# Altium footprint library connectors_socets.pcblib: 601 footprints (part 9 of 38)
Each footprint in its own frame and in the unit in brackets; x right, y up, seen from the top. Pads: shape width x height; smd on the part's side, far side on the other; paste and mask are expansions set on the pad; w line width, h text height; cw(c..) or ccw(c..) is an arc to the next point about the centre after c.
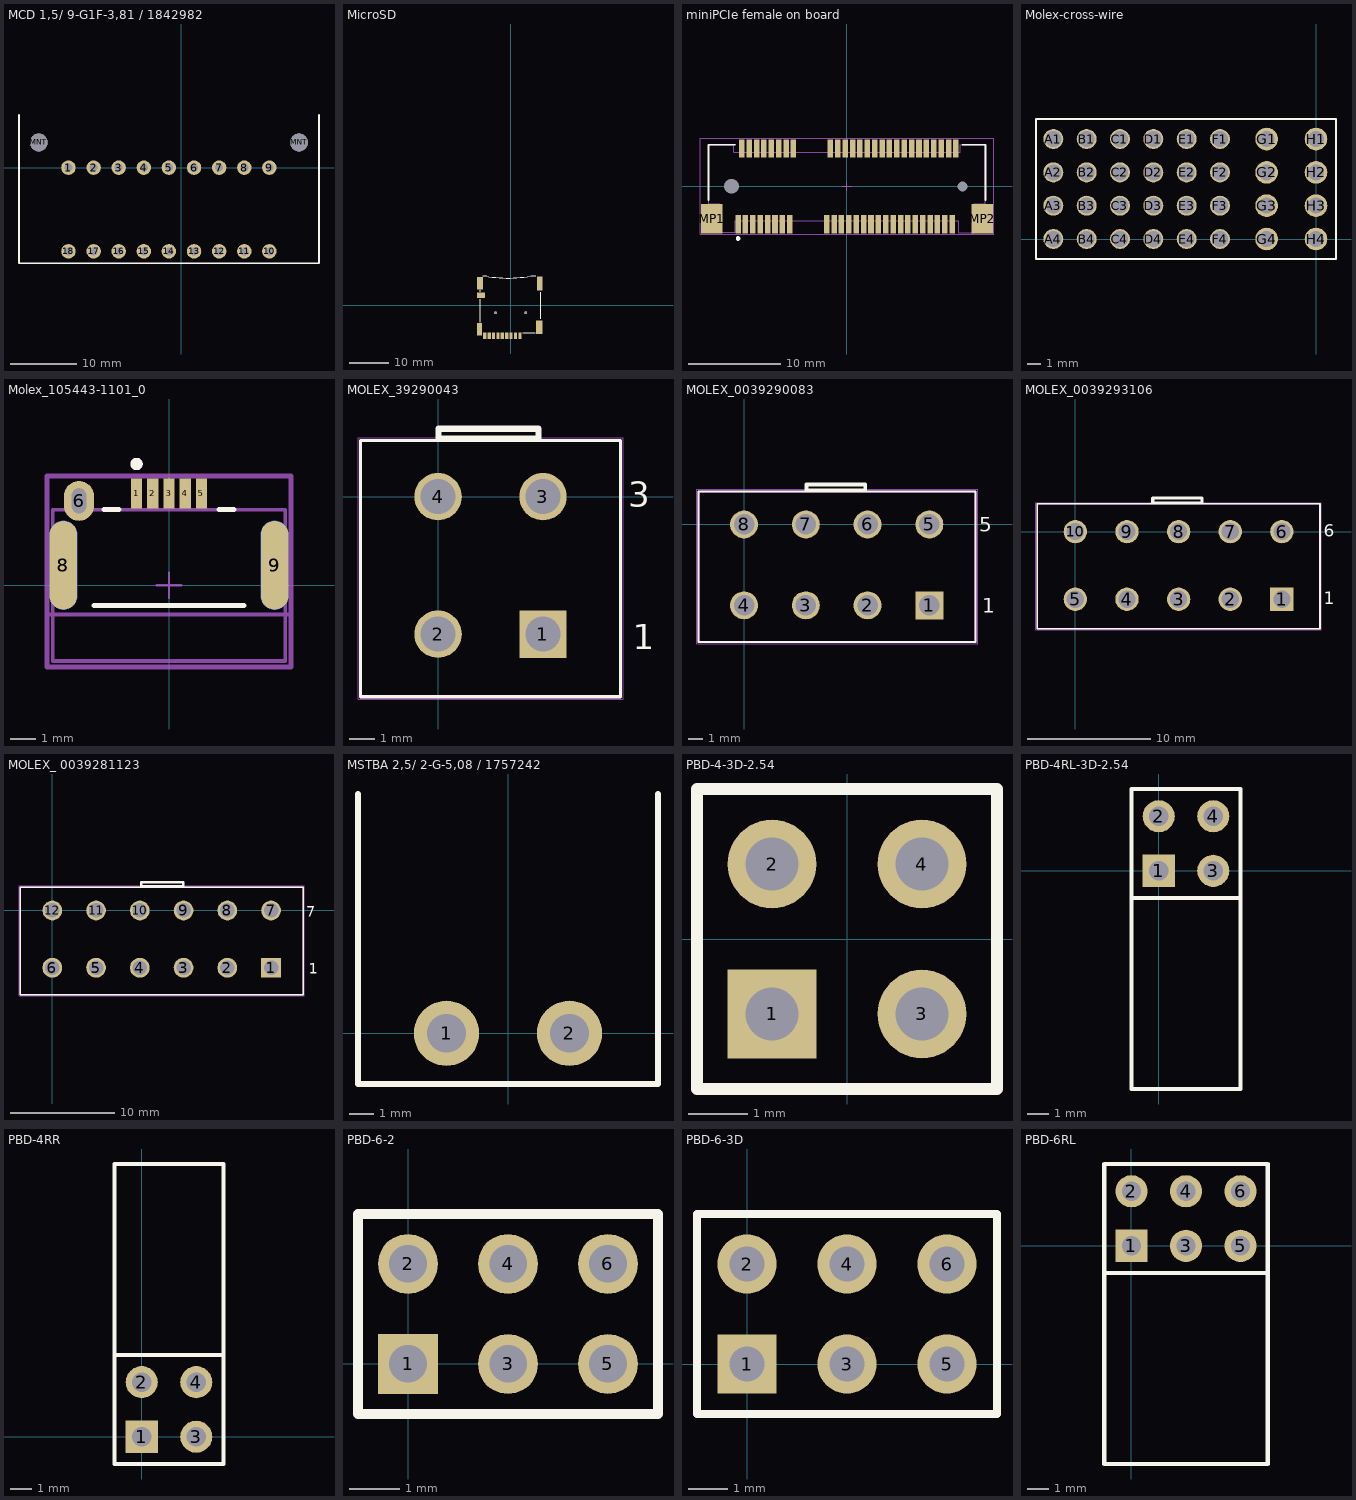
[diagram p8: the footprints below, top view; thin cyan lines are the x and y axes]

## MCD 1,5/ 9-G1F-3,81 / 1842982 [mm]
pads (20):
  round 2.2 hole 1.2: 1(-17.145,0) 2(-13.335,0) 3(-9.525,0) 4(-5.715,0) 5(-1.905,0) 6(1.905,0) 7(5.715,0) 8(9.525,0) 9(13.335,0) 10(13.335,-12.7) 11(9.525,-12.7) 12(5.715,-12.7) 13(1.905,-12.7) 14(-1.905,-12.7) 15(-5.715,-12.7) 16(-9.525,-12.7) 17(-13.335,-12.7) 18(-17.145,-12.7)
  round 2.7 hole 2.7 unplated: MNT(-21.645,3.81) MNT(17.835,3.81)
Top Overlay:
  lines w0.254: -24.645,8 -24.645,-14.5 20.855,-14.5 20.855,8
3D body "pxc_1842982_03_MCD-1-5-9-G1F-3-81_3D.stp": height 22.75, standoff -3.45, extent -24.25,-13.9 20.43,8

## MicroSD [mm]
pads (16):
  rect 1.2x3.1 smd: 0(-7.79,-6.044)
  rect 1.5x3.1 smd: 0(-7.64,5.456)
  round 0.7 hole 0.7 unplated: 0(-3.74,-1.894) 0(3.81,-1.894)
  rect 1.6x3.5 smd: 0(7.21,-5.544)
  rect 1.4x3.5 smd: 0(7.313,5.463)
  rect 0.8x1.6 smd: 1(2.335,-7.694) 2(1.235,-7.694) 3(0.135,-7.694) 4(-0.965,-7.694) 5(-2.065,-7.694) 6(-3.165,-7.694) 7(-4.265,-7.694) 8(-5.365,-7.694)
  rect 0.85x1.6 smd: 9(-6.515,-7.694)
  rect 1.95x1.4 smd: 10(-7.415,2.506)
Top Overlay:
  lines w0.127: -7.62,-4.307 -7.62,1.535 ; -7.62,3.313 -7.62,3.821 ; -6.985,7.377 -5.928,7.377 ; -6.362,7.345 ccw(c-0.637,36.794) 5.087,7.345 ; 3.01,-6.969 5.735,-6.969 6.16,-6.969 ; 5.08,7.377 6.35,7.377 6.345,7.382 ; 7.62,-3.418 7.62,3.186
3D body "User Library-Socket-MicroSD-Type1-with-SDCard.step": height 1.91, standoff -0.43, extent -7.75,-7.3 6.35,12.8

## miniPCIe female on board [mm]
pads (56):
  rect 0.6x2 smd: 1(-11.8,-4.1) 2(-11.4,4.1) 3(-11,-4.1) 4(-10.6,4.1) 5(-10.2,-4.1) 6(-9.8,4.1) 7(-9.4,-4.1) 8(-9,4.1) 9(-8.6,-4.1) 10(-8.2,4.1) 11(-7.8,-4.1) 12(-7.4,4.1) 13(-7,-4.1) 14(-6.6,4.1) 15(-6.2,-4.1) 16(-5.8,4.1) 17(-2.2,-4.1) 18(-1.8,4.1) 19(-1.4,-4.1) 20(-1,4.1) 21(-0.6,-4.1) 22(-0.2,4.1) 23(0.2,-4.1) 24(0.6,4.1) 25(1,-4.1) 26(1.4,4.1) 27(1.8,-4.1) 28(2.2,4.1) 29(2.6,-4.1) 30(3,4.1) 31(3.4,-4.1) 32(3.8,4.1) 33(4.2,-4.1) 34(4.6,4.1) 35(5,-4.1) 36(5.4,4.1) 37(5.8,-4.1) 38(6.2,4.1) 39(6.6,-4.1) 40(7,4.1) 41(7.4,-4.1) 42(7.8,4.1) 43(8.2,-4.1) 44(8.6,4.1) 45(9,-4.1) 46(9.4,4.1) 47(9.8,-4.1) 48(10.2,4.1) 49(10.6,-4.1) 50(11,4.1) 51(11.4,-4.1) 52(11.8,4.1)
  round 1.3 hole 1.6 unplated: MH1(-12.5,0)
  round 0.8 hole 1.1 unplated: MH2(12.5,0)
  rect 2.3x3.2 smd: MP1(-14.65,-3.5) MP2(14.65,-3.5)
Top Overlay:
  circle w0.25: c-11.8,-5.65 r0.125
  lines w0.2: -15,-1.5 -15,4.5 -12.1,4.5 ; 12.5,4.5 15,4.5 15,-1.5
Plata3D:
  lines w0.1: -15,-1.9 -15,4.5 -12.25,4.5 -12.25,3.7 12.25,3.7 12.25,4.5 15,4.5 15,-1.9 13.79,-1.9 13.79,-5 12.1,-5 12.1,-3.7 -12.1,-3.7 -12.1,-5 -13.79,-5 -13.79,-1.9 -15,-1.9
Board3D:
  lines w0.05: -15.9,-5.2 15.9,-5.2 15.9,5.2 -15.9,5.2 -15.9,-5.2
  lines w0.1: -0.5,0 0.5,0 ; 0,-0.5 0,0.5
3D body: height 0.82, standoff 0.2, extent 15,4.5 15,4.5
3D body "292443-1.STEP": height 5.61, standoff -0.59, extent -15,-5 15,4.5

## Molex-cross-wire [mm]
height 8
pads (32):
  round 1.5 hole 1.2: A1(-19.7,7.499) A2(-19.7,4.999) A3(-19.7,2.5) A4(-19.7,0) B1(-17.2,7.499) B2(-17.2,4.999) B3(-17.2,2.5) B4(-17.2,0) C1(-14.7,7.499) C2(-14.7,4.999) C3(-14.7,2.5) C4(-14.7,0) D1(-12.2,7.499) D2(-12.2,4.999) D3(-12.2,2.5) D4(-12.2,0) E1(-9.7,7.499) E2(-9.7,4.999) E3(-9.7,2.5) E4(-9.7,0) F1(-7.2,7.499) F2(-7.2,4.999) F3(-7.2,2.5) F4(-7.2,0)
  round 1.7 hole 1.2: G1(-3.7,7.499) G2(-3.7,4.999) G3(-3.7,2.5) G4(-3.7,0) H1(0,7.499) H2(0,4.999) H3(0,2.5) H4(0,0)
Top Overlay:
  lines w0.18: -21,-1.5 -21,9 1.5,9 1.5,-1.5 -21,-1.5

## Molex_105443-1101_0 [mm]
pads (10):
  rect 0.45x1.2 smd paste+0 mask+0: 1(-1.3,3.675) 2(-0.65,3.675) 3(0,3.675) 4(0.65,3.675) 5(1.3,3.675)
  oval 1.2x1.6 hole 1 slot 0.6 at 0 deg paste-2539.97 mask+0: 6(-3.6,3.375)
  oval 1.1x3.55 smd paste-1000 mask+0: 8(-4.225,0.8) 9(4.225,0.8)
  oval 1.1x3.55 smd far side paste-1000 mask+0: 8(-4.225,0.8) 9(4.225,0.8)
Top Overlay:
  circle w0.25: c-1.3,4.85 r0.125
  lines w0.2: -3,-0.8 3,-0.8 ; -2.6,3.025 -2,3.025 ; 2,3.025 2.6,3.025
Mechanical 10:
  lines w0.2: -4.875,-3.275 -4.875,4.375 4.875,4.375 4.875,-3.275 -4.875,-3.275
  text ".Designator" at 0,0.55 h1
Mechanical 12:
  lines w0.15: -4.875,-1.175 4.875,-1.175 ; -4.65,-3.025 -4.65,3.025 4.65,3.025 4.65,-3.025 -4.65,-3.025
Board3D:
  lines w0.1: -0.5,0 0.5,0 ; 0,-0.5 0,0.5
  lines w0.2: -4.875,-3.275 -4.875,4.375 4.875,4.375 4.875,-3.275 -4.875,-3.275
3D body "3dmodel.step": height 0.25, standoff 0, extent -4.875,-3.275 4.875,4.375

## MOLEX_39290043 [mm]
height 12.8
pads (4):
  rect 1.9x1.9 / inner round 1.9 / far side rect 1.9x1.9 hole 1.4 mask+0.076: 1(4.2,-5.5)
  round 1.9 hole 1.4 mask+0.076: 2(0,-5.5) 3(4.2,0) 4(0,0)
Top Overlay:
  lines w0.127: -3.1,-8 -3.1,2.25 7.3,2.25 7.3,-8 -3.1,-8
  lines w0.254: 0.017,2.314 4.017,2.314 4.017,2.714 0.017,2.714 0.017,2.314
  text "1" at 7.8,-6.1 h1
  text "3" at 7.6,-0.4 h1
Plata3D:
  lines w0.127: -3.1,-8 -3.1,2.25 7.3,2.25 7.3,-8 -3.1,-8
Board3D:
  lines w0.05: -3.2,-8.1 -3.2,2.356 7.4,2.356 7.4,-8.1 -3.2,-8.1
3D body "39-29-0043--3DModel-STEP-361473.STEP": height 12.8, standoff -3.5, extent -3.1,-7.725 7.297,3.275

## MOLEX_0039290083 [mm]
height 12.8
pads (8):
  rect 1.9x1.9 / inner round 1.9 / far side rect 1.9x1.9 hole 1.4 mask+0.076: 1(12.6,-5.5)
  round 1.9 hole 1.4 mask+0.076: 2(8.4,-5.5) 3(4.2,-5.5) 4(0,-5.5) 5(12.6,0) 6(8.4,0) 7(4.2,0) 8(0,0)
Top Overlay:
  lines w0.127: -3.1,-8 -3.1,2.25 15.75,2.25 15.75,-8 -3.1,-8
  lines w0.254: 4.238,2.322 8.238,2.322 8.238,2.722 4.238,2.722 4.238,2.322
  text "5" at 16,-0.5 h1
  text "1" at 16.2,-6 h1
Plata3D:
  lines w0.127: -3.1,-8 -3.1,2.25 15.75,2.25 15.75,-8 -3.1,-8
Board3D:
  lines w0.05: -3.2,-8.1 15.882,-8.1 15.882,2.4 -3.2,2.4 -3.2,-8.1
3D body "0039290083.SLDPRT": height 12.8, standoff -3.5, extent -3.047,-7.75 15.75,3.25

## MOLEX_0039293106 [mm]
height 12.8
pads (10):
  rect 1.9x1.9 / inner round 1.9 / far side rect 1.9x1.9 hole 1.4 mask+0.076: 1(16.8,-5.5)
  round 1.9 hole 1.4 mask+0.076: 2(12.6,-5.5) 3(8.4,-5.5) 4(4.2,-5.5) 5(0,-5.5) 6(16.8,0) 7(12.6,0) 8(8.4,0) 9(4.2,0) 10(0,0)
Top Overlay:
  lines w0.127: -3.1,-7.9 19.9,-7.9 19.9,2.25 -3.1,2.25 -3.1,-7.9
  lines w0.254: 6.294,2.332 10.294,2.332 10.294,2.732 6.294,2.732 6.294,2.332
  text "6" at 20.2,-0.4 h1
  text "1" at 20.2,-5.9 h1
Plata3D:
  lines w0.127: -3.1,-7.9 19.9,-7.9 19.9,2.25 -3.1,2.25 -3.1,-7.9
Board3D:
  lines w0.05: -3.2,-8 20,-8 20,2.351 -3.2,2.351 -3.2,-8
3D body "0039293106.SLDPRT": height 12.8, standoff -3.5, extent -3.114,-7.648 19.883,3.352

## MOLEX_ 0039281123 [mm]
height 12.8
pads (12):
  rect 1.9x1.9 / inner round 1.9 / far side rect 1.9x1.9 hole 1.4 mask+0.076: 1(21,-5.5)
  round 1.9 hole 1.4 mask+0.076: 2(16.8,-5.5) 3(12.6,-5.5) 4(8.4,-5.5) 5(4.2,-5.5) 6(0,-5.5) 7(21,0) 8(16.8,0) 9(12.6,0) 10(8.4,0) 11(4.2,0) 12(0,0)
Top Overlay:
  lines w0.127: -3.1,-8.1 -3.1,2.25 24.1,2.25 24.1,-8.1 -3.1,-8.1
  lines w0.254: 8.553,2.318 12.553,2.318 12.553,2.718 8.553,2.718 8.553,2.318
  text "1" at 24.6,-6.1 h1
  text "7" at 24.4,-0.6 h1
Plata3D:
  lines w0.127: -3.1,-8.1 -3.1,2.25 24.1,2.25 24.1,-8.1 -3.1,-8.1
Board3D:
  lines w0.05: -3.2,-8.2 24.206,-8.2 24.206,2.351 -3.2,2.351 -3.2,-8.2
3D body "39-28-1123--3DModel-STEP-361473.STEP": height 12.8, standoff -3.5, extent -3.1,-7.8 24.097,3.2

## MSTBA 2,5/ 2-G-5,08 / 1757242 [mm]
pads (2):
  round 2.7 hole 1.6: 1(-2.54,0) 2(2.54,0)
Top Overlay:
  lines w0.254: -6.2,9.9 -6.2,-2.1 6.2,-2.1 6.2,9.9
3D body "pxc_1757242_06_MSTBA-2-5-2-G-5-08_3D.stp": height 8.65, standoff -3.45, extent -6.08,-2 6.08,10.002

## PBD-4-3D-2.54 [mm] "Connector; Header; 2x2 Position"
height 8
pads (4):
  rect 1.5x1.5 hole 0.9: 1(-1.27,-1.27)
  round 1.5 hole 0.9: 2(-1.27,1.27) 3(1.27,-1.27) 4(1.27,1.27)
Top Overlay:
  lines w0.2: -2.54,-2.54 2.54,-2.54 2.54,2.54 -2.54,2.54 -2.54,-2.54
3D body "PBD-2.stp": height 8.5, standoff -3.15, extent -2.54,-2.54 0,2.54
3D body "PBD-2.stp": height 8.5, standoff -3.15, extent 0,-2.54 2.54,2.54

## PBD-4RL-3D-2.54 [mm] "Connector; Header; 2x2 Position"
height 5
pads (4):
  rect 1.5x1.5 hole 0.9: 1(0,0)
  round 1.5 hole 0.9: 2(0,2.54) 3(2.54,0) 4(2.54,2.54)
Top Overlay:
  lines w0.2: -1.27,-1.27 -1.27,-10.16 3.81,-10.16 3.81,-1.27 ; -1.27,-1.27 3.81,-1.27 ; -1.27,-1.27 -1.27,3.81 3.81,3.81 3.81,-1.27
3D body "PBD-4R.step": height 5, standoff -3, extent -1.27,-10.16 3.81,2.84

## PBD-4RR [mm] "Connector; Header; 2x2 Position"
height 5
pads (4):
  rect 1.5x1.5 hole 0.9: 1(0,0)
  round 1.5 hole 0.9: 2(0,2.54) 3(2.54,0) 4(2.54,2.54)
Top Overlay:
  lines w0.2: -1.27,3.81 -1.27,-1.27 3.81,-1.27 3.81,3.81 ; -1.27,3.81 3.81,3.81 ; -1.27,3.81 -1.27,12.7 3.81,12.7 3.81,3.81
3D body "PBD-4R.step": height 5, standoff -3, extent -1.27,-0.3 3.81,12.7

## PBD-6-2 [mm] "Connector; Header; 3x2 Position"
height 4.5
pads (6):
  rect 1.2x1.2 hole 0.75: 1(0,0)
  round 1.2 hole 0.75: 2(0,2) 3(2,0) 4(2,2) 5(4,0) 6(4,2)
Top Overlay:
  lines w0.2: -1,-1 -1,3 5,3 5,-1 -1,-1
3D body "PBD2mm.stp": height 4.5, standoff -2.7, extent -1,-1 1,3
3D body "PBD2mm.stp": height 4.5, standoff -2.7, extent 1,-1 3,3
3D body "PBD2mm.stp": height 4.5, standoff -2.7, extent 3,-1 5,3

## PBD-6-3D [mm] "Connector; Header; 3x2 Position"
height 8
pads (6):
  rect 1.5x1.5 hole 0.9: 1(0,0)
  round 1.5 hole 0.9: 2(0,2.54) 3(2.54,0) 4(2.54,2.54) 5(5.08,0) 6(5.08,2.54)
Top Overlay:
  lines w0.2: -1.27,-1.27 -1.27,3.81 6.35,3.81 6.35,-1.27 -1.27,-1.27
3D body "PBD-2.stp": height 8.5, standoff -3.15, extent 3.81,-1.27 6.35,3.81
3D body "PBD-2.stp": height 8.5, standoff -3.15, extent -1.27,-1.27 1.27,3.81
3D body "PBD-2.stp": height 8.5, standoff -3.15, extent 1.27,-1.27 3.81,3.81

## PBD-6RL [mm] "Connector; Header; 3x2 Position"
height 5
pads (6):
  rect 1.5x1.5 hole 0.9: 1(0,0)
  round 1.5 hole 0.9: 2(0,2.54) 3(2.54,0) 4(2.54,2.54) 5(5.08,0) 6(5.08,2.54)
Top Overlay:
  lines w0.2: -1.27,-1.27 6.35,-1.27 ; -1.27,-1.27 -1.27,3.81 6.35,3.81 6.35,-1.27 ; -1.27,-1.27 -1.27,-10.16 6.35,-10.16 6.35,-1.27
3D body "PBD-6R.step": height 5, standoff -3, extent -1.27,-10.16 6.35,2.84